# Altium footprint library Pcb-hionyPcbLib.PcbLib: 580 footprints (part 2 of 37)
Each footprint in its own frame and in the unit in brackets; x right, y up, seen from the top. Pads: shape width x height; smd on the part's side, far side on the other; paste and mask are expansions set on the pad; w line width, h text height; cw(c..) or ccw(c..) is an arc to the next point about the centre after c.
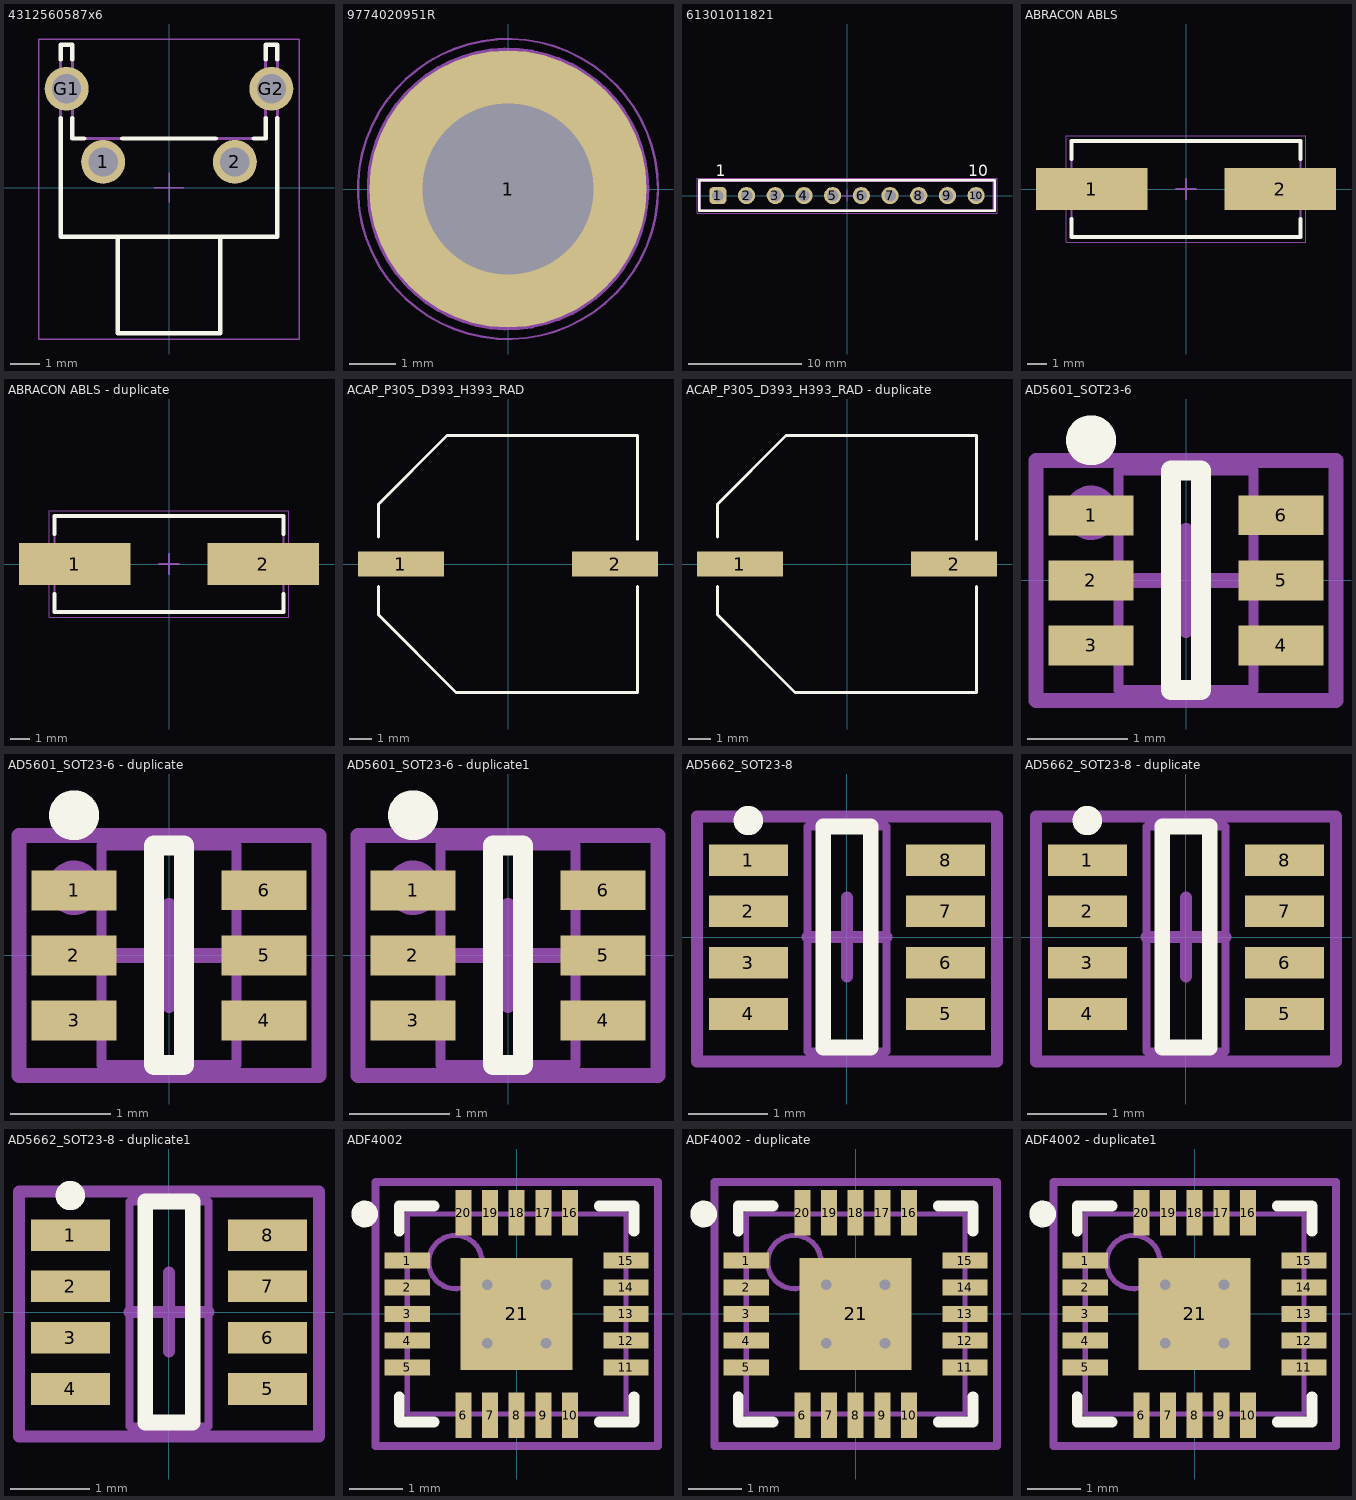
[diagram p1: the footprints below, top view; thin cyan lines are the x and y axes]

## 4312560587x6 [mm] "6x6mm right angle Tact Switch with ground terminal, THT version"
height 7.2
pads (4):
  round 1.5 hole 1: 1(-2.25,0.875) 2(2.25,0.875) G1(-3.5,3.375) G2(3.5,3.375)
Top Overlay:
  lines w0.15: -3.7,2.375 -3.7,-1.675 3.7,-1.675 3.7,2.375 ; -3.7,4.375 -3.7,4.875 -3.3,4.875 -3.3,4.375 ; -3.3,2.375 -3.3,1.675 -2.9,1.675 ; -1.75,-1.675 -1.75,-4.975 1.75,-4.975 1.75,-1.675 ; -1.6,1.675 1.6,1.675 ; 2.9,1.675 3.3,1.675 3.3,2.375 ; 3.3,4.375 3.3,4.875 3.7,4.875 3.7,4.375
Top Component Outline:
  lines w0.1: -1.75,-1.675 -1.75,-4.975 1.75,-4.975 1.75,-1.675 ; -3.7,-1.675 3.7,-1.675 3.7,4.875 3.3,4.875 3.3,1.675 -3.3,1.675 -3.3,4.875 -3.7,4.875 -3.7,-1.675
Top Courtyard:
  lines w0.05: -0.5,0 0.5,0 ; 0,-0.5 0,0.5 ; -4.45,-5.175 4.45,-5.175 4.45,5.075 -4.45,5.075 -4.45,-5.175
Top Designator:
  text ".Designator" at -7.498,-0.5 h1.5
3D body "4312560587x6.stp": height 7.25, standoff -3.45, extent -4.2,-4.975 4.2,4.875

## 9774020951R [mm]
pads (1):
  round 6 / inner round 0 / far side round 0 hole 3.7 unplated paste-10: 1(0,0)
Top Paste:
  region: 0.32,1.873 0.416,1.854 0.604,1.802 0.785,1.73 0.958,1.641 1.121,1.534 1.273,1.411 1.411,1.273 1.534,1.121 1.641,0.958 1.73,0.785 1.802,0.604 1.854,0.416 1.873,0.32 2.899,0.32 2.902,0.323 2.884,0.486 2.811,0.807 2.703,1.117 2.561,1.413 2.386,1.692 2.181,1.949 1.949,2.181 1.692,2.386 1.413,2.561 1.117,2.703 0.807,2.811 0.486,2.884 0.323,2.902
  region: -1.873,0.32 -1.854,0.416 -1.802,0.604 -1.73,0.785 -1.641,0.958 -1.534,1.121 -1.411,1.273 -1.273,1.411 -1.121,1.534 -0.958,1.641 -0.785,1.73 -0.604,1.802 -0.416,1.854 -0.32,1.873 -0.32,2.899 -0.323,2.902 -0.486,2.884 -0.807,2.811 -1.117,2.703 -1.413,2.561 -1.692,2.386 -1.949,2.181 -2.181,1.949 -2.386,1.692 -2.561,1.413 -2.703,1.117 -2.811,0.807 -2.884,0.486 -2.902,0.323
  region: -0.32,-1.873 -0.416,-1.854 -0.604,-1.802 -0.785,-1.73 -0.958,-1.641 -1.121,-1.534 -1.273,-1.411 -1.411,-1.273 -1.534,-1.121 -1.641,-0.958 -1.73,-0.785 -1.802,-0.604 -1.854,-0.416 -1.873,-0.32 -2.899,-0.32 -2.902,-0.323 -2.884,-0.486 -2.811,-0.807 -2.703,-1.117 -2.561,-1.413 -2.386,-1.692 -2.181,-1.949 -1.949,-2.181 -1.692,-2.386 -1.413,-2.561 -1.117,-2.703 -0.807,-2.811 -0.486,-2.884 -0.323,-2.902
  region: 1.873,-0.32 1.854,-0.416 1.802,-0.604 1.73,-0.785 1.641,-0.958 1.534,-1.121 1.411,-1.273 1.273,-1.411 1.121,-1.534 0.958,-1.641 0.785,-1.73 0.604,-1.802 0.416,-1.854 0.32,-1.873 0.32,-2.899 0.323,-2.902 0.486,-2.884 0.807,-2.811 1.117,-2.703 1.413,-2.561 1.692,-2.386 1.949,-2.181 2.181,-1.949 2.386,-1.692 2.561,-1.413 2.703,-1.117 2.811,-0.807 2.884,-0.486 2.902,-0.323
Mechanical 11:
  text ".Designator" at -0.106,0.748 h0.5
Mechanical 13:
  circle w0.127: c0,0 r3
Mechanical 15:
  circle w0.05: c0,0 r3.25
  lines w0.05: -0.3,0 0.3,0 ; 0,-0.3 0,0.3
3D body "9774020951R (rev1).stp": height 2, standoff -1.4, extent -2.55,-2.55 2.55,2.55

## 61301011821 [mm] "Socket Header, Pitch 2.54 mm, THT, Vertical, single row, 10p"
height 8.5
pads (10):
  rrect50% 1.52x1.52 hole 1.02: 1(-11.43,0)
  round 1.52 hole 1.02: 2(-8.89,0) 3(-6.35,0) 4(-3.81,0) 5(-1.27,0) 6(1.27,0) 7(3.81,0) 8(6.35,0) 9(8.89,0) 10(11.43,0)
Top Overlay:
  lines w0.2: -13.075,-1.35 13.075,-1.35 13.075,1.35 -13.075,1.35 -13.075,-1.35
  text "10" at 10.75,1.7 h1.02
  text "1" at -11.62,1.7 h1.02
Top Component Outline:
  lines w0.1: -12.95,-1.25 12.95,-1.25 12.95,1.25 -12.95,1.25 -12.95,-1.25
Top Courtyard:
  lines w0.05: -0.5,0 0.5,0 ; 0,-0.5 0,0.5 ; -13.275,-1.55 13.275,-1.55 13.275,1.55 -13.275,1.55 -13.275,-1.55
Top 3D Body:
  lines w0.1: -12.95,-1.25 12.95,-1.25 12.95,1.25 -12.95,1.25 -12.95,-1.25
Top Designator:
  text ".Designator" at -7.498,-0.5 h1.5
3D body "61301011821.stp": height 8.55, standoff -3.06, extent -12.95,-1.25 12.95,1.25

## ABRACON ABLS [mm]
pads (2):
  rect 5.6x2.1 smd: 1(-4.75,0) 2(4.75,0)
Top Overlay:
  lines w0.2: -5.775,-1.5 -5.775,-2.425 5.775,-2.425 5.775,-1.5 ; -5.775,1.5 -5.775,2.425 5.775,2.425 5.775,1.5
Mechanical 13:
  lines w0.1: -5.775,-2.425 -5.775,2.425 5.775,2.425 5.775,-2.425 -5.775,-2.425
Mechanical 15:
  lines w0.05: -6.025,-2.675 -6.025,2.675 6.025,2.675 6.025,-2.675 -6.025,-2.675
  lines w0.1: -0.5,0 0.5,0 ; 0,-0.5 0,0.5
3D body "HC49US SMT Crystal.STEP": height 4.2, standoff 0, extent -6.35,-2.35 6.35,2.35

## ABRACON ABLS - duplicate [mm]
pads (2):
  rect 5.6x2.1 smd: 1(-4.75,0) 2(4.75,0)
Top Overlay:
  lines w0.2: -5.775,-1.5 -5.775,-2.425 5.775,-2.425 5.775,-1.5 ; -5.775,1.5 -5.775,2.425 5.775,2.425 5.775,1.5
Mechanical 13:
  lines w0.1: -5.775,-2.425 -5.775,2.425 5.775,2.425 5.775,-2.425 -5.775,-2.425
Mechanical 15:
  lines w0.05: -6.025,-2.675 -6.025,2.675 6.025,2.675 6.025,-2.675 -6.025,-2.675
  lines w0.1: -0.5,0 0.5,0 ; 0,-0.5 0,0.5
3D body "HC49US SMT Crystal.STEP": height 4.2, standoff 0, extent -6.35,-2.35 6.35,2.35

## ACAP_P305_D393_H393_RAD [mm]
pads (2):
  rect 3.81x1.1 smd: 1(-4.75,0) 2(4.75,0)
Top Overlay:
  lines w0.127: -5.75,-1 -5.75,-2.25 -2.3,-5.7 5.75,-5.7 5.75,-1 ; -5.75,1.2 -5.75,2.65 -2.7,5.7 5.75,5.7 5.75,1.1
3D body "User Library-CC1010.step": height 10.41, standoff 0, extent -5.5,-5.2 5.5,5.2

## ACAP_P305_D393_H393_RAD - duplicate [mm]
pads (2):
  rect 3.81x1.1 smd: 1(-4.75,0) 2(4.75,0)
Top Overlay:
  lines w0.127: -5.75,-1 -5.75,-2.25 -2.3,-5.7 5.75,-5.7 5.75,-1 ; -5.75,1.2 -5.75,2.65 -2.7,5.7 5.75,5.7 5.75,1.1
3D body "User Library-CC1010.step": height 10.41, standoff 0, extent -5.5,-5.2 5.5,5.2

## AD5601_SOT23-6 [mm]
pads (6):
  rect 0.85x0.4 smd mask+0.05: 1(-0.95,0.65) 2(-0.95,0) 3(-0.95,-0.65) 4(0.95,-0.65) 5(0.95,0) 6(0.95,0.65)
Top Overlay:
  circle w0.25: c-0.95,1.4 r0.125
  lines w0.2: -0.15,-1.1 0.15,-1.1 0.15,1.1 -0.15,1.1 -0.15,-1.1
Mechanical 13:
  lines w0.1: -0.675,-1.1 -0.675,1.1 0.675,1.1 0.675,-1.1 -0.675,-1.1
Mechanical 15:
  circle w0.4: c-0.95,0.675 r0.071
  lines w0.15: -0.5,0 0.5,0 ; 0,-0.5 0,0.5 ; -1.5,-1.2 -1.5,1.2 1.5,1.2 1.5,-1.2 -1.5,-1.2
3D body "User Library-SC70-6.step": height 0.43, standoff -0.53, extent -1.05,-1 1.05,1

## AD5601_SOT23-6 - duplicate [mm]
pads (6):
  rect 0.85x0.4 smd mask+0.05: 1(-0.95,0.65) 2(-0.95,0) 3(-0.95,-0.65) 4(0.95,-0.65) 5(0.95,0) 6(0.95,0.65)
Top Overlay:
  circle w0.25: c-0.95,1.4 r0.125
  lines w0.2: -0.15,-1.1 -0.15,1.1 0.15,1.1 0.15,-1.1 -0.15,-1.1
Mechanical 13:
  lines w0.1: -0.675,-1.1 0.675,-1.1 0.675,1.1 -0.675,1.1 -0.675,-1.1
Mechanical 15:
  circle w0.4: c-0.95,0.675 r0.071
  lines w0.15: -0.5,0 0.5,0 ; 0,-0.5 0,0.5 ; -1.5,-1.2 1.5,-1.2 1.5,1.2 -1.5,1.2 -1.5,-1.2
3D body "User Library-SC70-6.step": height 0.43, standoff -0.53, extent -1.05,-1 1.05,1

## AD5601_SOT23-6 - duplicate1 [mm]
pads (6):
  rect 0.85x0.4 smd mask+0.05: 1(-0.95,0.65) 2(-0.95,0) 3(-0.95,-0.65) 4(0.95,-0.65) 5(0.95,0) 6(0.95,0.65)
Top Overlay:
  circle w0.25: c-0.95,1.4 r0.125
  lines w0.2: -0.15,-1.1 -0.15,1.1 0.15,1.1 0.15,-1.1 -0.15,-1.1
Mechanical 13:
  lines w0.1: -0.675,-1.1 0.675,-1.1 0.675,1.1 -0.675,1.1 -0.675,-1.1
Mechanical 15:
  circle w0.4: c-0.95,0.675 r0.071
  lines w0.15: -0.5,0 0.5,0 ; 0,-0.5 0,0.5 ; -1.5,-1.2 1.5,-1.2 1.5,1.2 -1.5,1.2 -1.5,-1.2
3D body "User Library-SC70-6.step": height 0.43, standoff -0.53, extent -1.05,-1 1.05,1

## AD5662_SOT23-8 [mm]
pads (8):
  rect 1x0.4 smd mask+0.05: 1(-1.25,0.975) 2(-1.25,0.325) 3(-1.25,-0.325) 4(-1.25,-0.975) 5(1.25,-0.975) 6(1.25,-0.325) 7(1.25,0.325) 8(1.25,0.975)
Top Overlay:
  circle w0.3: c-1.25,1.475 r0.035
  lines w0.2: -0.3,-1.4 0.3,-1.4 0.3,1.4 -0.3,1.4 -0.3,-1.4
Mechanical 13:
  lines w0.1: -0.5,-1.45 -0.5,1.4 0.5,1.4 0.5,-1.45 -0.5,-1.45
Mechanical 15:
  circle w0.2: c-1.275,0.975 r0.056
  lines w0.15: -0.5,0 0.5,0 ; 0,-0.5 0,0.5 ; -1.9,-1.575 -1.9,1.525 1.9,1.525 1.9,-1.575 -1.9,-1.575
  text ".Designator" at -0.875,-1.3 h0.55
3D body "User Library-sot238.step": height 1.2, standoff 0, extent -1.4,-1.49 1.4,1.45

## AD5662_SOT23-8 - duplicate [mm]
pads (8):
  rect 1x0.4 smd mask+0.05: 1(-1.25,0.975) 2(-1.25,0.325) 3(-1.25,-0.325) 4(-1.25,-0.975) 5(1.25,-0.975) 6(1.25,-0.325) 7(1.25,0.325) 8(1.25,0.975)
Top Overlay:
  circle w0.3: c-1.25,1.475 r0.035
  lines w0.2: -0.3,-1.4 0.3,-1.4 0.3,1.4 -0.3,1.4 -0.3,-1.4
Mechanical 13:
  lines w0.1: -0.5,-1.45 -0.5,1.4 0.5,1.4 0.5,-1.45 -0.5,-1.45
Mechanical 15:
  circle w0.2: c-1.275,0.975 r0.056
  lines w0.15: -0.5,0 0.5,0 ; 0,-0.5 0,0.5 ; -1.9,-1.575 -1.9,1.525 1.9,1.525 1.9,-1.575 -1.9,-1.575
  text ".Designator" at -0.875,-1.3 h0.55
3D body "User Library-sot238.step": height 1.2, standoff 0, extent -1.4,-1.49 1.4,1.45

## AD5662_SOT23-8 - duplicate1 [mm]
pads (8):
  rect 1x0.4 smd mask+0.05: 1(-1.25,0.975) 2(-1.25,0.325) 3(-1.25,-0.325) 4(-1.25,-0.975) 5(1.25,-0.975) 6(1.25,-0.325) 7(1.25,0.325) 8(1.25,0.975)
Top Overlay:
  circle w0.3: c-1.25,1.475 r0.035
  lines w0.2: -0.3,-1.4 0.3,-1.4 0.3,1.4 -0.3,1.4 -0.3,-1.4
Mechanical 13:
  lines w0.1: -0.5,-1.45 -0.5,1.4 0.5,1.4 0.5,-1.45 -0.5,-1.45
Mechanical 15:
  circle w0.2: c-1.275,0.975 r0.056
  lines w0.15: -0.5,0 0.5,0 ; 0,-0.5 0,0.5 ; -1.9,-1.575 -1.9,1.525 1.9,1.525 1.9,-1.575 -1.9,-1.575
  text ".Designator" at -0.875,-1.3 h0.55
3D body "User Library-sot238.step": height 1.2, standoff 0, extent -1.4,-1.49 1.4,1.45

## ADF4002 [mm]
pads (21):
  rect 0.85x0.3 smd mask+0.05: 1(-2.05,1) 2(-2.05,0.5) 3(-2.05,0) 4(-2.05,-0.5) 5(-2.05,-1) 11(2.05,-1) 12(2.05,-0.5) 13(2.05,0) 14(2.05,0.5) 15(2.05,1)
  rect 0.3x0.85 smd mask+0.05: 6(-1,-1.9) 7(-0.5,-1.9) 8(0,-1.9) 9(0.5,-1.9) 10(1,-1.9) 16(1,1.9) 17(0.5,1.9) 18(0,1.9) 19(-0.5,1.9) 20(-1,1.9)
  rect 2.1x2.1 smd: 21(0,0)
via 0.55,-0.55 diameter 0.5 hole 0.2
via -0.55,-0.55 diameter 0.5 hole 0.2
via 0.55,0.55 diameter 0.5 hole 0.2
via -0.55,0.55 diameter 0.5 hole 0.2
Top Overlay:
  circle w0.25: c-2.85,1.875 r0.125
  lines w0.2: -2.2,-1.55 -2.2,-2.025 -1.55,-2.025 ; -2.2,1.55 -2.2,2.025 -1.55,2.025 ; 1.55,-2.025 2.2,-2.025 2.2,-1.55 ; 1.55,2.025 2.2,2.025 2.2,1.55
Mechanical 13:
  circle w0.1: c-1.15,0.975 r0.5
  lines w0.1: -2.05,-1.875 2.05,-1.875 2.05,1.875 -2.05,1.875 -2.05,-1.875
Mechanical 15:
  lines w0.15: -0.5,0 0.5,0 ; 0,-0.5 0,0.5 ; -2.65,-2.475 2.65,-2.475 2.65,2.475 -2.65,2.475 -2.65,-2.475
  text ".Designator" at 0.925,0.913 h0.55
3D body "User Library-QFN4x4_20pins.step": height 0.8, standoff 0, extent -2.025,-2.02 2.015,2.02

## ADF4002 - duplicate [mm]
pads (21):
  rect 0.85x0.3 smd mask+0.05: 1(-2.05,1) 2(-2.05,0.5) 3(-2.05,0) 4(-2.05,-0.5) 5(-2.05,-1) 11(2.05,-1) 12(2.05,-0.5) 13(2.05,0) 14(2.05,0.5) 15(2.05,1)
  rect 0.3x0.85 smd mask+0.05: 6(-1,-1.9) 7(-0.5,-1.9) 8(0,-1.9) 9(0.5,-1.9) 10(1,-1.9) 16(1,1.9) 17(0.5,1.9) 18(0,1.9) 19(-0.5,1.9) 20(-1,1.9)
  rect 2.1x2.1 smd: 21(0,0)
via 0.55,-0.55 diameter 0.5 hole 0.2
via -0.55,-0.55 diameter 0.5 hole 0.2
via 0.55,0.55 diameter 0.5 hole 0.2
via -0.55,0.55 diameter 0.5 hole 0.2
Top Overlay:
  circle w0.25: c-2.85,1.875 r0.125
  lines w0.2: -2.2,-1.55 -2.2,-2.025 -1.55,-2.025 ; -2.2,1.55 -2.2,2.025 -1.55,2.025 ; 1.55,-2.025 2.2,-2.025 2.2,-1.55 ; 1.55,2.025 2.2,2.025 2.2,1.55
Mechanical 13:
  circle w0.1: c-1.15,0.975 r0.5
  lines w0.1: -2.05,-1.875 2.05,-1.875 2.05,1.875 -2.05,1.875 -2.05,-1.875
Mechanical 15:
  lines w0.15: -0.5,0 0.5,0 ; 0,-0.5 0,0.5 ; -2.65,-2.475 2.65,-2.475 2.65,2.475 -2.65,2.475 -2.65,-2.475
  text ".Designator" at 0.925,0.913 h0.55
3D body "User Library-QFN4x4_20pins.step": height 0.8, standoff 0, extent -2.025,-2.02 2.015,2.02

## ADF4002 - duplicate1 [mm]
pads (21):
  rect 0.85x0.3 smd mask+0.05: 1(-2.05,1) 2(-2.05,0.5) 3(-2.05,0) 4(-2.05,-0.5) 5(-2.05,-1) 11(2.05,-1) 12(2.05,-0.5) 13(2.05,0) 14(2.05,0.5) 15(2.05,1)
  rect 0.3x0.85 smd mask+0.05: 6(-1,-1.9) 7(-0.5,-1.9) 8(0,-1.9) 9(0.5,-1.9) 10(1,-1.9) 16(1,1.9) 17(0.5,1.9) 18(0,1.9) 19(-0.5,1.9) 20(-1,1.9)
  rect 2.1x2.1 smd: 21(0,0)
via 0.55,-0.55 diameter 0.5 hole 0.2
via -0.55,-0.55 diameter 0.5 hole 0.2
via 0.55,0.55 diameter 0.5 hole 0.2
via -0.55,0.55 diameter 0.5 hole 0.2
Top Overlay:
  circle w0.25: c-2.85,1.875 r0.125
  lines w0.2: -2.2,-1.55 -2.2,-2.025 -1.55,-2.025 ; -2.2,1.55 -2.2,2.025 -1.55,2.025 ; 1.55,-2.025 2.2,-2.025 2.2,-1.55 ; 1.55,2.025 2.2,2.025 2.2,1.55
Mechanical 13:
  circle w0.1: c-1.15,0.975 r0.5
  lines w0.1: -2.05,-1.875 2.05,-1.875 2.05,1.875 -2.05,1.875 -2.05,-1.875
Mechanical 15:
  lines w0.15: -0.5,0 0.5,0 ; 0,-0.5 0,0.5 ; -2.65,-2.475 2.65,-2.475 2.65,2.475 -2.65,2.475 -2.65,-2.475
  text ".Designator" at 0.925,0.913 h0.55
3D body "User Library-QFN4x4_20pins.step": height 0.8, standoff 0, extent -2.025,-2.02 2.015,2.02